# Altium footprint library Connectors.PcbLib: 122 footprints (part 3 of 8)
Each footprint in its own frame and in the unit in brackets; x right, y up, seen from the top. Pads: shape width x height; smd on the part's side, far side on the other; paste and mask are expansions set on the pad; w line width, h text height; cw(c..) or ccw(c..) is an arc to the next point about the centre after c.
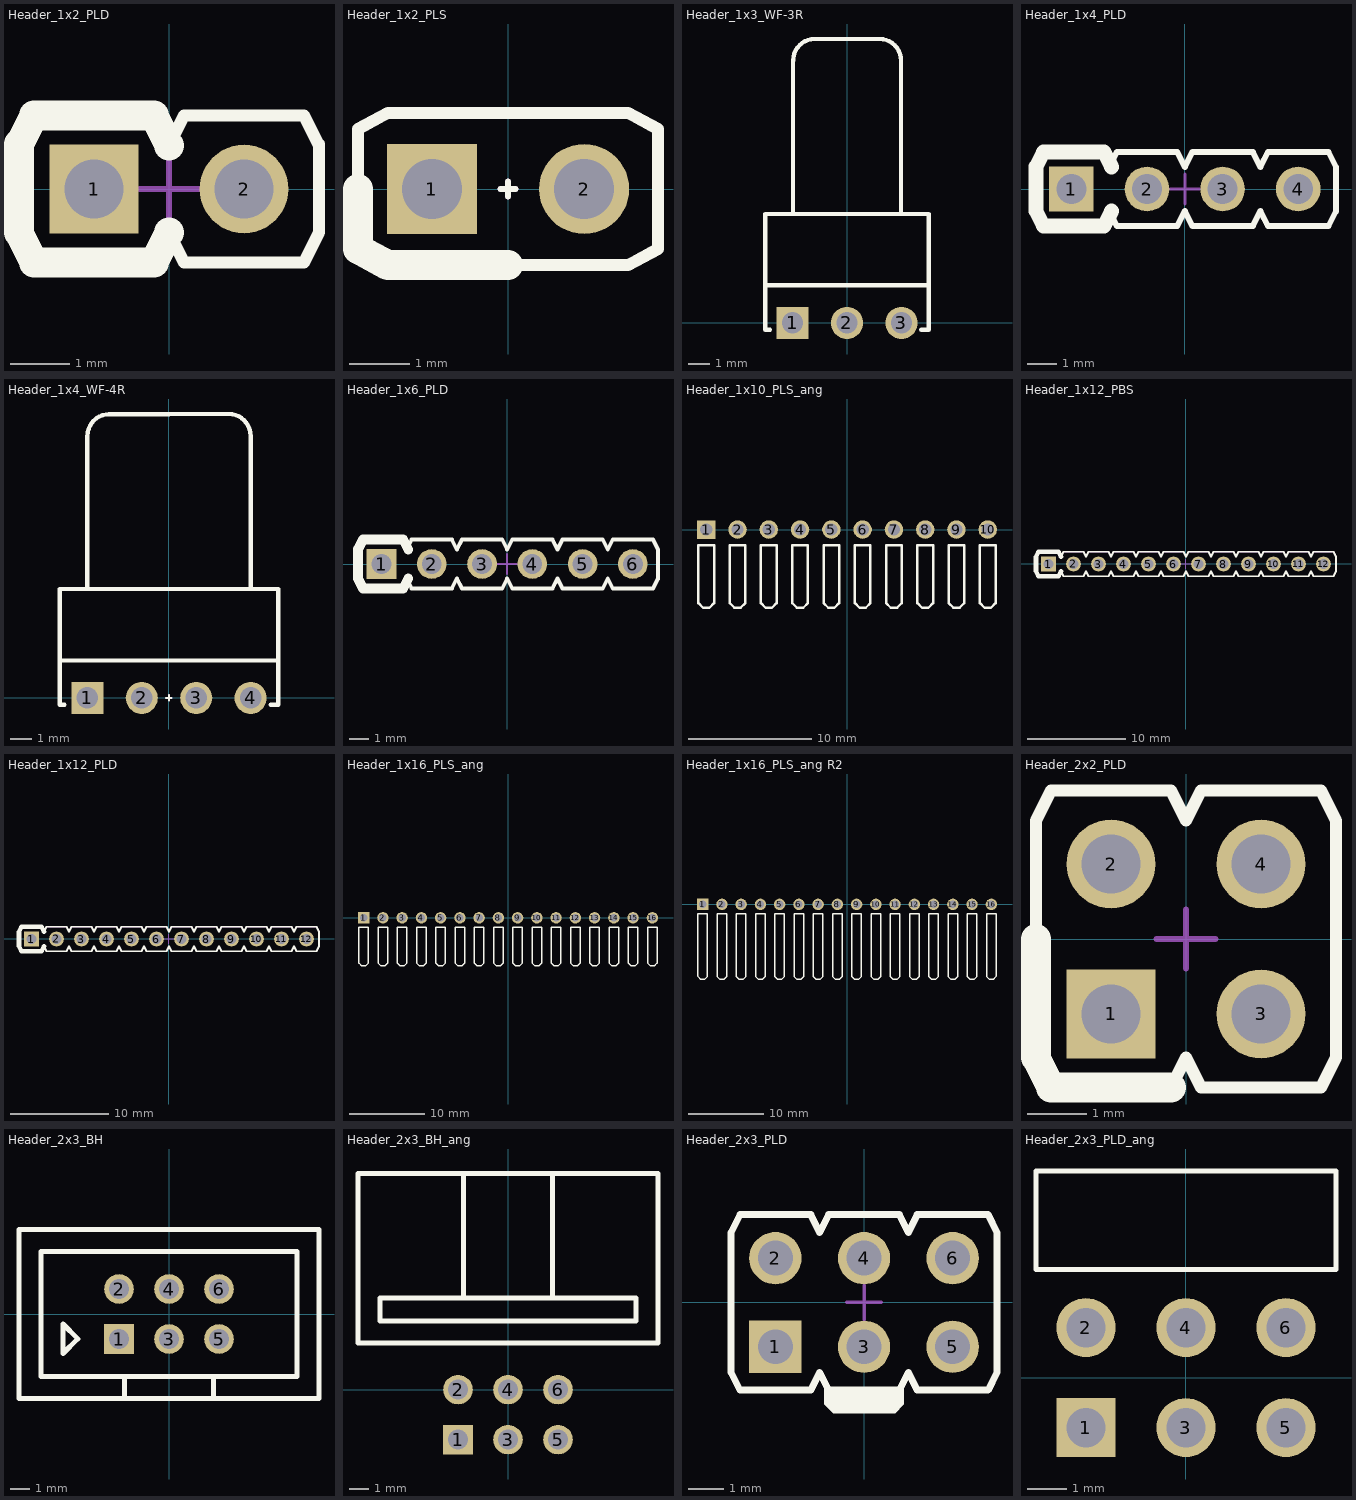
[diagram p2: the footprints below, top view; thin cyan lines are the x and y axes]

## Header_1x2_PLD [mm] "4 Contacts - Pitch 2.54mm - Dual Row Through Mount Straight Header (Post Lead = 6.35mm, Tail Lead 3.05mm, Insulator 1.52mm)"
height 7.87
pads (2):
  rect 1.5x1.5 hole 1: 1(-1.27,0)
  round 1.5 hole 1: 2(1.27,0)
Top Overlay:
  lines w0.2: -2.54,-0.737 -2.54,0.762 ; -2.286,-1.245 -0.254,-1.245 ; 0,-0.737 0.254,-1.245 2.286,-1.245 2.54,-0.737 2.54,0.762 ; 0,0.737 0.254,1.245 2.286,1.245 2.54,0.737
  lines w0.5: -2.54,0.737 -2.286,1.245 -0.254,1.245 0,0.737 ; -2.54,0.762 -2.54,-0.737 -2.286,-1.245 -0.254,-1.245 0,-0.737
Mechanical 8:
  lines w0.1: -0.5,0 0,0 ; 0,-0.5 0,0 ; 0,0.5 0,0 ; 0.5,0 0,0
Mechanical 14:
  lines w0.1: -2.54,0.737 -2.286,1.245 -0.254,1.245 0,0.737 0.254,1.245 2.286,1.245 2.54,0.737 ; -2.54,0.762 -2.54,-0.737 -2.286,-1.245 -0.254,-1.245 0,-0.737 0.254,-1.245 2.286,-1.245 2.54,-0.737 2.54,0.762
3D body "HN-1x2.STEP": height 10.1, standoff -1.5, extent -2.54,-1.27 2.54,1.27

## Header_1x2_PLS [mm] "4 Contacts - Pitch 2.54mm - Dual Row Through Mount Straight Header (Post Lead = 6.35mm, Tail Lead 3.05mm, Insulator 1.52mm)"
height 5.8
pads (2):
  rect 1.5x1.5 hole 1: 1(-1.27,0)
  round 1.5 hole 1: 2(1.27,0)
Top Overlay:
  lines w0.1: -0.125,0 0,0 ; 0,-0.125 0,0 ; 0,0.125 0,0 ; 0.125,0 0,0
  lines w0.2: -2.5,-1 -2.5,1 -2,1.27 2,1.27 2.5,1 2.5,-1 2,-1.27 -2,-1.27 -2.5,-1
  lines w0.5: -2.5,0 -2.5,-1 -2,-1.27 0,-1.27
Mechanical 8:
  lines w0.1: -0.125,0 0,0 ; 0,-0.125 0,0 ; 0,0.125 0,0 ; 0.125,0 0,0
Mechanical 13:
  lines w0.05: -2.5,-1 -2,-1.27 2,-1.27 2.5,-1 2.5,1 2,1.27 -2,1.27 -2.5,1 -2.5,-1
3D body "HN-1x2.STEP": height 10.1, standoff -1.5, extent -2.54,-1.27 2.54,1.27

## Header_1x3_WF-3R [mm] "4 Contacts - Pitch 2.54mm - Dual Row Through Mount Straight Header (Post Lead = 6.35mm, Tail Lead 3.05mm, Insulator 1.52mm)"
height 5.8
pads (3):
  rect 1.5x1.5 hole 1: 1(-2.54,0)
  round 1.5 hole 1: 2(0,0) 3(2.54,0)
Top Overlay:
  lines w0.1: -0.125,0 0,0 ; 0,-0.125 0,0 ; 0,0.125 0,0 ; 0.125,0 0,0
  lines w0.2: -3.81,5.076 -3.81,-0.324 -3.59,-0.324 ; -3.81,5.08 3.81,5.08 3.81,-0.32 3.462,-0.32 ; -3.783,1.75 3.81,1.75 ; -2.52,5.098 -2.52,9.241 ; -2.52,9.231 -2.52,12.236 ; -2.51,12.236 cw(c-1.51,12.236) -1.51,13.236 ; -1.51,13.237 1.52,13.237 ; 1.52,13.236 cw(c1.52,12.236) 2.52,12.236 ; 2.52,5.102 2.52,9.244 2.52,12.25
Mechanical 8:
  lines w0.1: -0.125,0 0,0 ; 0,-0.125 0,0 ; 0,0.125 0,0 ; 0.125,0 0,0
3D body "DS1070-3_MR.STEP": height 5.8, standoff -1.75, extent -3.81,-0.32 3.81,13.25

## Header_1x4_PLD [mm] "6 Contacts - Pitch 2.54mm - Single Row Through Mount Straight Header (Post Lead = 6.35mm, Tail Lead 3.05mm, Insulator 1.52mm)"
pads (4):
  rect 1.5x1.5 hole 1: 1(-3.81,0)
  round 1.5 hole 1: 2(-1.27,0) 3(1.27,0) 4(3.81,0)
Top Overlay:
  lines w0.2: -2.54,-0.737 -2.286,-1.245 -0.254,-1.245 0,-0.737 0.254,-1.245 2.286,-1.245 2.54,-0.737 2.794,-1.245 4.826,-1.245 5.08,-0.737 ; -2.54,0.737 -2.286,1.245 -0.254,1.245 0,0.737 0.254,1.245 2.286,1.245 2.54,0.737 2.794,1.245 4.826,1.245 5.08,0.737 5.08,-0.762
  lines w0.5: -5,0.737 -4.746,1.245 -2.714,1.245 -2.46,0.737 ; -5,0.762 -5,-0.737 -4.746,-1.245 -2.714,-1.245 -2.46,-0.737
Mechanical 8:
  lines w0.1: -0.5,0 0,0 ; 0,-0.5 0,0 ; 0,0.5 0,0 ; 0.5,0 0,0
3D body "HN-1x2.STEP": height 10.1, standoff -1.5, extent 0,-1.27 5.08,1.27
3D body "HN-1x2.STEP": height 10.1, standoff -1.5, extent -5.08,-1.27 0,1.27

## Header_1x4_WF-4R [mm] "4 Contacts - Pitch 2.54mm - Dual Row Through Mount Straight Header (Post Lead = 6.35mm, Tail Lead 3.05mm, Insulator 1.52mm)"
height 5.8
pads (4):
  rect 1.5x1.5 hole 1: 1(-3.81,0)
  round 1.5 hole 1: 2(-1.27,0) 3(1.27,0) 4(3.81,0)
Top Overlay:
  lines w0.1: -0.125,0 0,0 ; 0,-0.125 0,0 ; 0,0.125 0,0 ; 0.125,0 0,0
  lines w0.2: -5.1,1.75 5.1,1.75 ; -4.88,-0.32 -5.1,-0.32 -5.1,5.08 5.1,5.08 5.1,-0.32 4.752,-0.32 ; -3.81,5.102 -3.81,9.244 ; -3.81,9.235 -3.81,12.24 ; -3.8,12.24 cw(c-2.8,12.24) -2.8,13.24 ; -2.8,13.241 0,13.241 ; 0,13.25 2.8,13.25 cw(c2.8,12.25) 3.8,12.25 ; 3.81,5.102 3.81,9.244 3.81,12.25
Mechanical 8:
  lines w0.1: -0.125,0 0,0 ; 0,-0.125 0,0 ; 0,0.125 0,0 ; 0.125,0 0,0
3D body "DS1070-4_MR.STEP": height 5.8, standoff -1.75, extent -5.1,-0.32 5.1,13.25

## Header_1x6_PLD [mm] "6 Contacts - Pitch 2.54mm - Single Row Through Mount Straight Header (Post Lead = 6.35mm, Tail Lead 3.05mm, Insulator 1.52mm)"
pads (6):
  rect 1.5x1.5 hole 1: 1(-6.35,0)
  round 1.5 hole 1: 2(-3.81,0) 3(-1.27,0) 4(1.27,0) 5(3.81,0) 6(6.35,0)
Top Overlay:
  lines w0.2: -5.08,-0.737 -4.826,-1.245 -2.794,-1.245 -2.54,-0.737 -2.286,-1.245 -0.254,-1.245 0,-0.737 0.254,-1.245 2.286,-1.245 2.54,-0.737 2.794,-1.245 4.826,-1.245 5.08,-0.737 5.334,-1.245 7.366,-1.245 7.62,-0.737 ; -5.08,0.737 -4.826,1.245 -2.794,1.245 -2.54,0.737 -2.286,1.245 -0.254,1.245 0,0.737 0.254,1.245 2.286,1.245 2.54,0.737 2.794,1.245 4.826,1.245 5.08,0.737 5.334,1.245 7.366,1.245 7.62,0.737 7.62,-0.762
  lines w0.5: -7.54,0.737 -7.286,1.245 -5.254,1.245 -5,0.737 ; -7.54,0.762 -7.54,-0.737 -7.286,-1.245 -5.254,-1.245 -5,-0.737
Mechanical 8:
  lines w0.1: -0.5,0 0,0 ; 0,-0.5 0,0 ; 0,0.5 0,0 ; 0.5,0 0,0
3D body "HN-1x2.STEP": height 10.1, standoff -1.5, extent -2.54,-1.27 2.54,1.27
3D body "HN-1x2.STEP": height 10.1, standoff -1.5, extent -7.62,-1.27 -2.54,1.27
3D body "HN-1x2.STEP": height 10.1, standoff -1.5, extent 2.54,-1.27 7.62,1.27

## Header_1x10_PLS_ang [mm]
height 0.6
pads (10):
  rect 1.5x1.5 hole 1: 1(-11.43,0)
  round 1.5 hole 1: 2(-8.89,0) 3(-6.35,0) 4(-3.81,0) 5(-1.27,0) 6(1.27,0) 7(3.81,0) 8(6.35,0) 9(8.89,0) 10(11.43,0)
Top Overlay:
  lines w0.2: -12.065,-5.969 -12.065,-1.27 -10.795,-1.27 -10.795,-5.969 -11.176,-6.35 -11.684,-6.35 -12.065,-5.969 ; -9.525,-5.969 -9.525,-1.27 -8.255,-1.27 -8.255,-5.969 -8.636,-6.35 -9.144,-6.35 -9.525,-5.969 ; -6.985,-5.969 -6.985,-1.27 -5.715,-1.27 -5.715,-5.969 -6.096,-6.35 -6.604,-6.35 -6.985,-5.969 ; -4.445,-5.969 -4.445,-1.27 -3.175,-1.27 -3.175,-5.969 -3.556,-6.35 -4.064,-6.35 -4.445,-5.969 ; -1.905,-5.969 -1.905,-1.27 -0.635,-1.27 -0.635,-5.969 -1.016,-6.35 -1.524,-6.35 -1.905,-5.969 ; 0.635,-5.969 0.635,-1.27 1.905,-1.27 1.905,-5.969 1.524,-6.35 1.016,-6.35 0.635,-5.969 ; 3.175,-5.969 3.175,-1.27 4.445,-1.27 4.445,-5.969 4.064,-6.35 3.556,-6.35 3.175,-5.969 ; 5.715,-5.969 5.715,-1.27 6.985,-1.27 6.985,-5.969 6.604,-6.35 6.096,-6.35 5.715,-5.969 ; 8.255,-5.969 8.255,-1.27 9.525,-1.27 9.525,-5.969 9.144,-6.35 8.636,-6.35 8.255,-5.969 ; 10.795,-5.969 11.176,-6.35 11.684,-6.35 12.065,-5.969 12.065,-1.27 10.795,-1.27 10.795,-5.969
3D body "PLSR-10-3-2.54mm.STEP": height 4.36, standoff -3, extent -12.7,-6.58 12.7,1.27

## Header_1x12_PBS [mm]
pads (12):
  rect 1.5x1.5 hole 1: 1(-13.97,0)
  round 1.5 hole 1: 2(-11.43,0) 3(-8.89,0) 4(-6.35,0) 5(-3.81,0) 6(-1.27,0) 7(1.27,0) 8(3.81,0) 9(6.35,0) 10(8.89,0) 11(11.43,0) 12(13.97,0)
Top Overlay:
  lines w0.2: -12.446,-1.245 -12.7,-0.737 -12.446,-1.245 ; -12.446,-1.245 -10.414,-1.245 -10.16,-0.737 -9.906,-1.245 -7.874,-1.245 -7.62,-0.737 -7.366,-1.245 -5.334,-1.245 -5.08,-0.737 -4.826,-1.245 -2.794,-1.245 -2.54,-0.737 -2.286,-1.245 -0.254,-1.245 0,-0.737 0.254,-1.245 2.286,-1.245 2.54,-0.737 2.794,-1.245 4.826,-1.245 5.08,-0.737 5.334,-1.245 7.366,-1.245 7.62,-0.737 7.874,-1.245 9.906,-1.245 10.16,-0.737 10.414,-1.245 12.446,-1.245 ; -12.446,1.245 -12.7,0.737 -12.446,1.245 ; -12.446,1.245 -10.414,1.245 -10.16,0.737 -9.906,1.245 -7.874,1.245 -7.62,0.737 -7.366,1.245 -5.334,1.245 -5.08,0.737 -4.826,1.245 -2.794,1.245 -2.54,0.737 -2.286,1.245 -0.254,1.245 0,0.737 0.254,1.245 2.286,1.245 2.54,0.737 2.794,1.245 4.826,1.245 5.08,0.737 5.334,1.245 7.366,1.245 7.62,0.737 7.874,1.245 9.906,1.245 10.16,0.737 10.414,1.245 12.446,1.245 ; 12.446,-1.245 12.7,-0.737 ; 12.446,-1.245 12.7,-0.737 ; 12.446,1.245 12.7,0.737 ; 12.446,1.245 12.7,0.737 ; 12.7,-0.737 12.954,-1.245 14.986,-1.245 15.24,-0.737 15.24,0.737 14.986,1.245 12.954,1.245 12.7,0.737
  lines w0.5: -12.7,-0.737 -12.954,-1.245 -14.986,-1.245 -15.24,-0.737 -15.24,0.737 -14.986,1.245 -12.954,1.245 -12.7,0.737
Mechanical 8:
  lines w0.1: -0.5,0 0,0 ; 0,-0.5 0,0 ; 0,0.5 0,0 ; 0.5,0 0,0
Mechanical 14:
  lines w0.1: -0.254,-1.245 -2.286,-1.245 -2.54,-0.737 -2.794,-1.245 -4.826,-1.245 -5.08,-0.737 -5.334,-1.245 -7.366,-1.245 -7.62,-0.737 -7.874,-1.245 -9.906,-1.245 -10.16,-0.737 -10.414,-1.245 -12.446,-1.245 ; 0.254,-1.245 2.286,-1.245 2.54,-0.737 2.794,-1.245 4.826,-1.245 5.08,-0.737 5.334,-1.245 7.366,-1.245 7.62,-0.737 7.874,-1.245 9.906,-1.245 10.16,-0.737 10.414,-1.245 12.446,-1.245 ; 15.24,-0.737 14.986,-1.245 12.954,-1.245 12.7,-0.737 ; 15.24,0.737 14.986,1.245 12.954,1.245 12.7,0.737 ; -15.24,-0.737 -15.24,0.737 ; -15.24,-0.737 -15.24,0.737 ; -15.24,-0.737 -14.986,-1.245 -12.954,-1.245 -12.7,-0.737 ; -15.24,0.737 -14.986,1.245 -12.954,1.245 -12.7,0.737 ; -12.7,-0.737 -12.446,-1.245 ; -12.7,-0.737 -12.446,-1.245 ; -12.7,0.737 -12.446,1.245 ; -12.7,0.737 -12.446,1.245 ; -12.446,1.245 -10.414,1.245 -10.16,0.737 -9.906,1.245 -7.874,1.245 -7.62,0.737 -7.366,1.245 -5.334,1.245 -5.08,0.737 -4.826,1.245 -2.794,1.245 -2.54,0.737 -2.286,1.245 -0.254,1.245 0,0.737 0.254,1.245 2.286,1.245 2.54,0.737 2.794,1.245 4.826,1.245 5.08,0.737 5.334,1.245 7.366,1.245 7.62,0.737 7.874,1.245 9.906,1.245 10.16,0.737 10.414,1.245 12.446,1.245 ; 12.446,-1.245 12.7,-0.737 ; 12.446,-1.245 12.7,-0.737 ; 12.446,1.245 12.7,0.737 ; 12.446,1.245 12.7,0.737
3D body "PBS-12-8.5.STEP": height 8.6, standoff -2.9, extent -15.49,-1.25 15.49,1.25

## Header_1x12_PLD [mm]
pads (12):
  rect 1.5x1.5 hole 1: 1(-13.97,0)
  round 1.5 hole 1: 2(-11.43,0) 3(-8.89,0) 4(-6.35,0) 5(-3.81,0) 6(-1.27,0) 7(1.27,0) 8(3.81,0) 9(6.35,0) 10(8.89,0) 11(11.43,0) 12(13.97,0)
Top Overlay:
  lines w0.2: -12.446,-1.245 -10.414,-1.245 -10.16,-0.737 -9.906,-1.245 -7.874,-1.245 -7.62,-0.737 -7.366,-1.245 -5.334,-1.245 -5.08,-0.737 -4.826,-1.245 -2.794,-1.245 -2.54,-0.737 -2.286,-1.245 -0.254,-1.245 0,-0.737 0.254,-1.245 2.286,-1.245 2.54,-0.737 2.794,-1.245 4.826,-1.245 5.08,-0.737 5.334,-1.245 7.366,-1.245 7.62,-0.737 7.874,-1.245 9.906,-1.245 10.16,-0.737 10.414,-1.245 12.446,-1.245 ; -12.446,-1.245 -12.7,-0.737 -12.446,-1.245 ; -12.446,1.245 -12.7,0.737 -12.446,1.245 ; -12.446,1.245 -10.414,1.245 -10.16,0.737 -9.906,1.245 -7.874,1.245 -7.62,0.737 -7.366,1.245 -5.334,1.245 -5.08,0.737 -4.826,1.245 -2.794,1.245 -2.54,0.737 -2.286,1.245 -0.254,1.245 0,0.737 0.254,1.245 2.286,1.245 2.54,0.737 2.794,1.245 4.826,1.245 5.08,0.737 5.334,1.245 7.366,1.245 7.62,0.737 7.874,1.245 9.906,1.245 10.16,0.737 10.414,1.245 12.446,1.245 ; 12.446,-1.245 12.7,-0.737 ; 12.446,-1.245 12.7,-0.737 ; 12.446,1.245 12.7,0.737 ; 12.446,1.245 12.7,0.737 ; 12.7,-0.737 12.954,-1.245 14.986,-1.245 15.24,-0.737 15.24,0.737 14.986,1.245 12.954,1.245 12.7,0.737
  lines w0.5: -12.7,-0.737 -12.954,-1.245 -14.986,-1.245 -15.24,-0.737 -15.24,0.737 -14.986,1.245 -12.954,1.245 -12.7,0.737
Mechanical 8:
  lines w0.1: -0.5,0 0,0 ; 0,-0.5 0,0 ; 0,0.5 0,0 ; 0.5,0 0,0
Mechanical 14:
  lines w0.1: -0.254,-1.245 -2.286,-1.245 -2.54,-0.737 -2.794,-1.245 -4.826,-1.245 -5.08,-0.737 -5.334,-1.245 -7.366,-1.245 -7.62,-0.737 -7.874,-1.245 -9.906,-1.245 -10.16,-0.737 -10.414,-1.245 -12.446,-1.245 ; 0.254,-1.245 2.286,-1.245 2.54,-0.737 2.794,-1.245 4.826,-1.245 5.08,-0.737 5.334,-1.245 7.366,-1.245 7.62,-0.737 7.874,-1.245 9.906,-1.245 10.16,-0.737 10.414,-1.245 12.446,-1.245 ; 15.24,-0.737 14.986,-1.245 12.954,-1.245 12.7,-0.737 ; 15.24,0.737 14.986,1.245 12.954,1.245 12.7,0.737 ; -15.24,-0.737 -14.986,-1.245 -12.954,-1.245 -12.7,-0.737 ; -15.24,-0.737 -15.24,0.737 ; -15.24,-0.737 -15.24,0.737 ; -15.24,0.737 -14.986,1.245 -12.954,1.245 -12.7,0.737 ; -12.7,-0.737 -12.446,-1.245 ; -12.7,-0.737 -12.446,-1.245 ; -12.7,0.737 -12.446,1.245 ; -12.7,0.737 -12.446,1.245 ; -12.446,1.245 -10.414,1.245 -10.16,0.737 -9.906,1.245 -7.874,1.245 -7.62,0.737 -7.366,1.245 -5.334,1.245 -5.08,0.737 -4.826,1.245 -2.794,1.245 -2.54,0.737 -2.286,1.245 -0.254,1.245 0,0.737 0.254,1.245 2.286,1.245 2.54,0.737 2.794,1.245 4.826,1.245 5.08,0.737 5.334,1.245 7.366,1.245 7.62,0.737 7.874,1.245 9.906,1.245 10.16,0.737 10.414,1.245 12.446,1.245 ; 12.446,-1.245 12.7,-0.737 ; 12.446,-1.245 12.7,-0.737 ; 12.446,1.245 12.7,0.737 ; 12.446,1.245 12.7,0.737
3D body "HN-1x2.STEP": height 10.2, standoff -1.4, extent 10.16,-1.27 15.24,1.27
3D body "HN-1x2.STEP": height 10.2, standoff -1.4, extent 5.08,-1.27 10.16,1.27
3D body "HN-1x2.STEP": height 10.2, standoff -1.4, extent 0,-1.27 5.08,1.27
3D body "HN-1x2.STEP": height 10.2, standoff -1.4, extent -5.08,-1.27 0,1.27
3D body "HN-1x2.STEP": height 10.2, standoff -1.4, extent -10.16,-1.27 -5.08,1.27
3D body "HN-1x2.STEP": height 10.2, standoff -1.4, extent -15.24,-1.27 -10.16,1.27

## Header_1x16_PLS_ang [mm]
height 0.6
pads (16):
  rect 1.5x1.5 hole 1: 1(-19.05,0)
  round 1.5 hole 1: 2(-16.51,0) 3(-13.97,0) 4(-11.43,0) 5(-8.89,0) 6(-6.35,0) 7(-3.81,0) 8(-1.27,0) 9(1.27,0) 10(3.81,0) 11(6.35,0) 12(8.89,0) 13(11.43,0) 14(13.97,0) 15(16.51,0) 16(19.05,0)
Top Overlay:
  lines w0.2: -19.685,-5.969 -19.685,-1.27 -18.415,-1.27 -18.415,-5.969 -18.796,-6.35 -19.304,-6.35 -19.685,-5.969 ; -17.145,-5.969 -17.145,-1.27 -15.875,-1.27 -15.875,-5.969 -16.256,-6.35 -16.764,-6.35 -17.145,-5.969 ; -14.605,-5.969 -14.605,-1.27 -13.335,-1.27 -13.335,-5.969 -13.716,-6.35 -14.224,-6.35 -14.605,-5.969 ; -12.065,-5.969 -11.684,-6.35 -11.176,-6.35 -10.795,-5.969 -10.795,-1.27 -12.065,-1.27 -12.065,-5.969 ; -9.525,-5.969 -9.144,-6.35 -8.636,-6.35 -8.255,-5.969 -8.255,-1.27 -9.525,-1.27 -9.525,-5.969 ; -6.985,-5.969 -6.604,-6.35 -6.096,-6.35 -5.715,-5.969 -5.715,-1.27 -6.985,-1.27 -6.985,-5.969 ; -4.445,-5.969 -4.064,-6.35 -3.556,-6.35 -3.175,-5.969 -3.175,-1.27 -4.445,-1.27 -4.445,-5.969 ; -1.905,-5.969 -1.524,-6.35 -1.016,-6.35 -0.635,-5.969 -0.635,-1.27 -1.905,-1.27 -1.905,-5.969 ; 0.635,-5.969 1.016,-6.35 1.524,-6.35 1.905,-5.969 1.905,-1.27 0.635,-1.27 0.635,-5.969 ; 3.175,-5.969 3.556,-6.35 4.064,-6.35 4.445,-5.969 4.445,-1.27 3.175,-1.27 3.175,-5.969 ; 5.715,-5.969 6.096,-6.35 6.604,-6.35 6.985,-5.969 6.985,-1.27 5.715,-1.27 5.715,-5.969 ; 8.255,-5.969 8.636,-6.35 9.144,-6.35 9.525,-5.969 9.525,-1.27 8.255,-1.27 8.255,-5.969 ; 10.795,-5.969 10.795,-1.27 12.065,-1.27 12.065,-5.969 11.684,-6.35 11.176,-6.35 10.795,-5.969 ; 13.335,-5.969 13.335,-1.27 14.605,-1.27 14.605,-5.969 14.224,-6.35 13.716,-6.35 13.335,-5.969 ; 15.875,-5.969 15.875,-1.27 17.145,-1.27 17.145,-5.969 16.764,-6.35 16.256,-6.35 15.875,-5.969 ; 18.415,-5.969 18.415,-1.27 19.685,-1.27 19.685,-5.969 19.304,-6.35 18.796,-6.35 18.415,-5.969
3D body "PLSR-16-3-2.54mm.STEP": height 4.36, standoff -3, extent -20.32,-6.58 20.32,1.27

## Header_1x16_PLS_ang R2 [mm]
height 0.6
pads (16):
  rect 1.5x1.5 hole 1: 1(-19.05,0)
  round 1.5 hole 1: 2(-16.51,0) 3(-13.97,0) 4(-11.43,0) 5(-8.89,0) 6(-6.35,0) 7(-3.81,0) 8(-1.27,0) 9(1.27,0) 10(3.81,0) 11(6.35,0) 12(8.89,0) 13(11.43,0) 14(13.97,0) 15(16.51,0) 16(19.05,0)
Top Overlay:
  lines w0.2: -19.685,-9.525 -19.304,-9.906 -18.796,-9.906 -18.415,-9.525 -18.415,-1.27 -19.685,-1.27 -19.685,-9.525 ; -17.145,-9.525 -17.145,-1.27 -15.875,-1.27 -15.875,-9.525 -16.256,-9.906 -16.764,-9.906 -17.145,-9.525 ; -14.605,-9.525 -14.605,-1.27 -13.335,-1.27 -13.335,-9.525 -13.716,-9.906 -14.224,-9.906 -14.605,-9.525 ; -12.065,-9.525 -12.065,-1.27 -10.795,-1.27 -10.795,-9.525 -11.176,-9.906 -11.684,-9.906 -12.065,-9.525 ; -9.525,-9.525 -9.525,-1.27 -8.255,-1.27 -8.255,-9.525 -8.636,-9.906 -9.144,-9.906 -9.525,-9.525 ; -6.985,-9.525 -6.985,-1.27 -5.715,-1.27 -5.715,-9.525 -6.096,-9.906 -6.604,-9.906 -6.985,-9.525 ; -4.445,-9.525 -4.445,-1.27 -3.175,-1.27 -3.175,-9.525 -3.556,-9.906 -4.064,-9.906 -4.445,-9.525 ; -1.905,-9.525 -1.905,-1.27 -0.635,-1.27 -0.635,-9.525 -1.016,-9.906 -1.524,-9.906 -1.905,-9.525 ; 0.635,-9.525 0.635,-1.27 1.905,-1.27 1.905,-9.525 1.524,-9.906 1.016,-9.906 0.635,-9.525 ; 3.175,-9.525 3.175,-1.27 4.445,-1.27 4.445,-9.525 4.064,-9.906 3.556,-9.906 3.175,-9.525 ; 5.715,-9.525 5.715,-1.27 6.985,-1.27 6.985,-9.525 6.604,-9.906 6.096,-9.906 5.715,-9.525 ; 8.255,-9.525 8.255,-1.27 9.525,-1.27 9.525,-9.525 9.144,-9.906 8.636,-9.906 8.255,-9.525 ; 10.795,-9.525 10.795,-1.27 12.065,-1.27 12.065,-9.525 11.684,-9.906 11.176,-9.906 10.795,-9.525 ; 13.335,-9.525 13.335,-1.27 14.605,-1.27 14.605,-9.525 14.224,-9.906 13.716,-9.906 13.335,-9.525 ; 15.875,-9.525 15.875,-1.27 17.145,-1.27 17.145,-9.525 16.764,-9.906 16.256,-9.906 15.875,-9.525 ; 18.415,-9.525 18.415,-1.27 19.685,-1.27 19.685,-9.525 19.304,-9.906 18.796,-9.906 18.415,-9.525
3D body "PLS-16-1-2.54mm.STEP": height 2.52, standoff -2.98, extent -20.32,-9.897 20.32,0.323

## Header_2x2_PLD [mm] "4 Contacts - Pitch 2.54mm - Dual Row Through Mount Straight Header (Post Lead = 6.35mm, Tail Lead 3.05mm, Insulator 1.52mm)"
height 7.87
pads (4):
  rect 1.5x1.5 hole 1: 1(-1.27,-1.27)
  round 1.5 hole 1: 2(-1.27,1.27) 3(1.27,-1.27) 4(1.27,1.27)
Top Overlay:
  lines w0.2: -2.286,-2.515 -0.254,-2.515 0,-2.007 0.254,-2.515 2.286,-2.515 2.54,-2.007 ; -2.54,2.007 -2.54,-2.007 -2.54,2.007 ; -2.54,2.007 -2.286,2.515 -0.254,2.515 0,2.007 0.254,2.515 2.286,2.515 2.54,2.007 ; 2.54,-2.007 2.54,2.007 ; 2.54,-2.007 2.54,2.007
  lines w0.5: -2.54,0 -2.54,-2.007 -2.286,-2.515 -0.254,-2.515
Mechanical 8:
  lines w0.1: -0.5,0 0,0 ; 0,-0.5 0,0 ; 0,0.5 0,0 ; 0.5,0 0,0
Mechanical 14:
  lines w0.1: 2.54,-2.007 2.54,2.007 ; 2.54,-2.007 2.54,2.007 ; 2.54,-2.007 2.286,-2.515 0.254,-2.515 0,-2.007 -0.254,-2.515 -2.286,-2.515 -2.54,-2.007 -2.54,2.007 -2.286,2.515 -0.254,2.515 0,2.007 0.254,2.515 2.286,2.515 2.54,2.007
3D body "SAMTEC_MTLW-102-07-L-D-250.stp": height 7.87, standoff -3.05, extent -2.54,-2.514 2.54,2.515

## Header_2x3_BH [mm] "BH-6_IDC-6_DS-1013-06S"
height 9
pads (6):
  rect 1.5x1.5 hole 1: 1(-2.54,-1.27)
  round 1.5 hole 1: 2(-2.54,1.27) 3(0,-1.27) 4(0,1.27) 5(2.54,-1.27) 6(2.54,1.27)
Top Overlay:
  lines w0.254: -2.25,-4.3 -2.25,-3.18 2.25,-3.18 2.25,-4.3 ; -7.62,-4.3 7.62,-4.3 7.62,4.3 -7.62,4.3 -7.62,-4.3 ; -6.5,-3.18 -6.5,3.18 6.5,3.18 6.5,-3.18 -6.5,-3.18 ; -5.385,-2.01 -4.635,-1.26 -5.385,-0.51 -5.385,-2.01
3D body "BH-6_IDC-6_DS-1013-06S.STEP": height 9, standoff -3, extent -7.62,-4.375 7.62,4.725

## Header_2x3_BH_ang [mm] "BH-6R_IDC-6MR_DS-1013-06R"
height 9
pads (6):
  rect 1.5x1.5 hole 1: 1(-2.54,-2.54)
  round 1.5 hole 1: 2(-2.54,0) 3(0,-2.54) 4(0,0) 5(2.54,-2.54) 6(2.54,0)
Top Overlay:
  lines w0.254: -2.25,10.97 -2.25,4.645 2.25,4.645 2.25,10.97 ; -7.62,2.37 7.62,2.37 7.62,10.97 -7.62,10.97 -7.62,2.37 ; -6.5,3.49 6.5,3.49 6.5,4.645 -6.5,4.645 -6.5,3.49
3D body "BH-6R_IDC-6MR_DS-1013-06R.STEP": height 8.93, standoff -2.72, extent -7.62,-2.83 7.62,10.97

## Header_2x3_PLD [mm] "6 Contacts - Pitch 2.54mm - Dual Row Through Mount Straight Header (Post Lead = 6.35mm, Tail Lead 3.05mm, Insulator 1.52mm)"
height 7.87
pads (6):
  rect 1.5x1.5 hole 1: 1(-2.54,-1.27)
  round 1.5 hole 1: 2(-2.54,1.27) 3(0,-1.27) 4(0,1.27) 5(2.54,-1.27) 6(2.54,1.27)
Top Overlay:
  region: -1.143,-2.464 -1.143,-2.921 -0.889,-3.175 0.889,-3.175 1.143,-2.921 1.143,-2.464
  region: -0.991,-2.515
  pour cut-out: -1.016,-2.515
  lines w0.2: 3.81,-2.007 3.81,2.007 ; 3.81,-2.007 3.556,-2.515 1.524,-2.515 1.27,-2.007 1.016,-2.515 -1.016,-2.515 -1.27,-2.007 -1.524,-2.515 -3.556,-2.515 -3.81,-2.007 -3.81,2.007 -3.556,2.515 -1.524,2.515 -1.27,2.007 -1.016,2.515 1.016,2.515 1.27,2.007 1.524,2.515 3.556,2.515 3.81,2.007 ; 3.81,-2.007 3.81,2.007
Mechanical 8:
  lines w0.1: -0.5,0 0,0 ; 0,-0.5 0,0 ; 0,0.5 0,0 ; 0.5,0 0,0
Mechanical 14:
  lines w0.1: 3.81,-2.007 3.81,2.007 ; 3.81,-2.007 3.556,-2.515 1.524,-2.515 1.27,-2.007 1.016,-2.515 -1.016,-2.515 -1.27,-2.007 -1.524,-2.515 -3.556,-2.515 -3.81,-2.007 -3.81,2.007 -3.556,2.515 -1.524,2.515 -1.27,2.007 -1.016,2.515 1.016,2.515 1.27,2.007 1.524,2.515 3.556,2.515 3.81,2.007 ; 3.81,-2.007 3.81,2.007
3D body "BH-6_PLD-6.stp": height 7.87, standoff -3.05, extent -3.81,-2.514 3.81,2.515

## Header_2x3_PLD_ang [mm]
height 0.6
pads (6):
  rect 1.5x1.5 hole 1: 1(-2.54,-1.27)
  round 1.5 hole 1: 2(-2.54,1.27) 3(0,-1.27) 4(0,1.27) 5(2.54,-1.27) 6(2.54,1.27)
Top Overlay:
  lines w0.127: -3.81,2.75 3.81,2.75 3.81,5.25 -3.81,5.25 -3.81,2.75
3D body "HR-2x3.STEP": height 5.08, standoff -2, extent -3.81,-1.612 3.81,11.25